# Altium footprint library QFP_LQFP_TQFP.PcbLib: 18 footprints (part 1 of 2)
Each footprint in its own frame and in the unit in brackets; x right, y up, seen from the top. Pads: shape width x height; smd on the part's side, far side on the other; paste and mask are expansions set on the pad; w line width, h text height; cw(c..) or ccw(c..) is an arc to the next point about the centre after c.
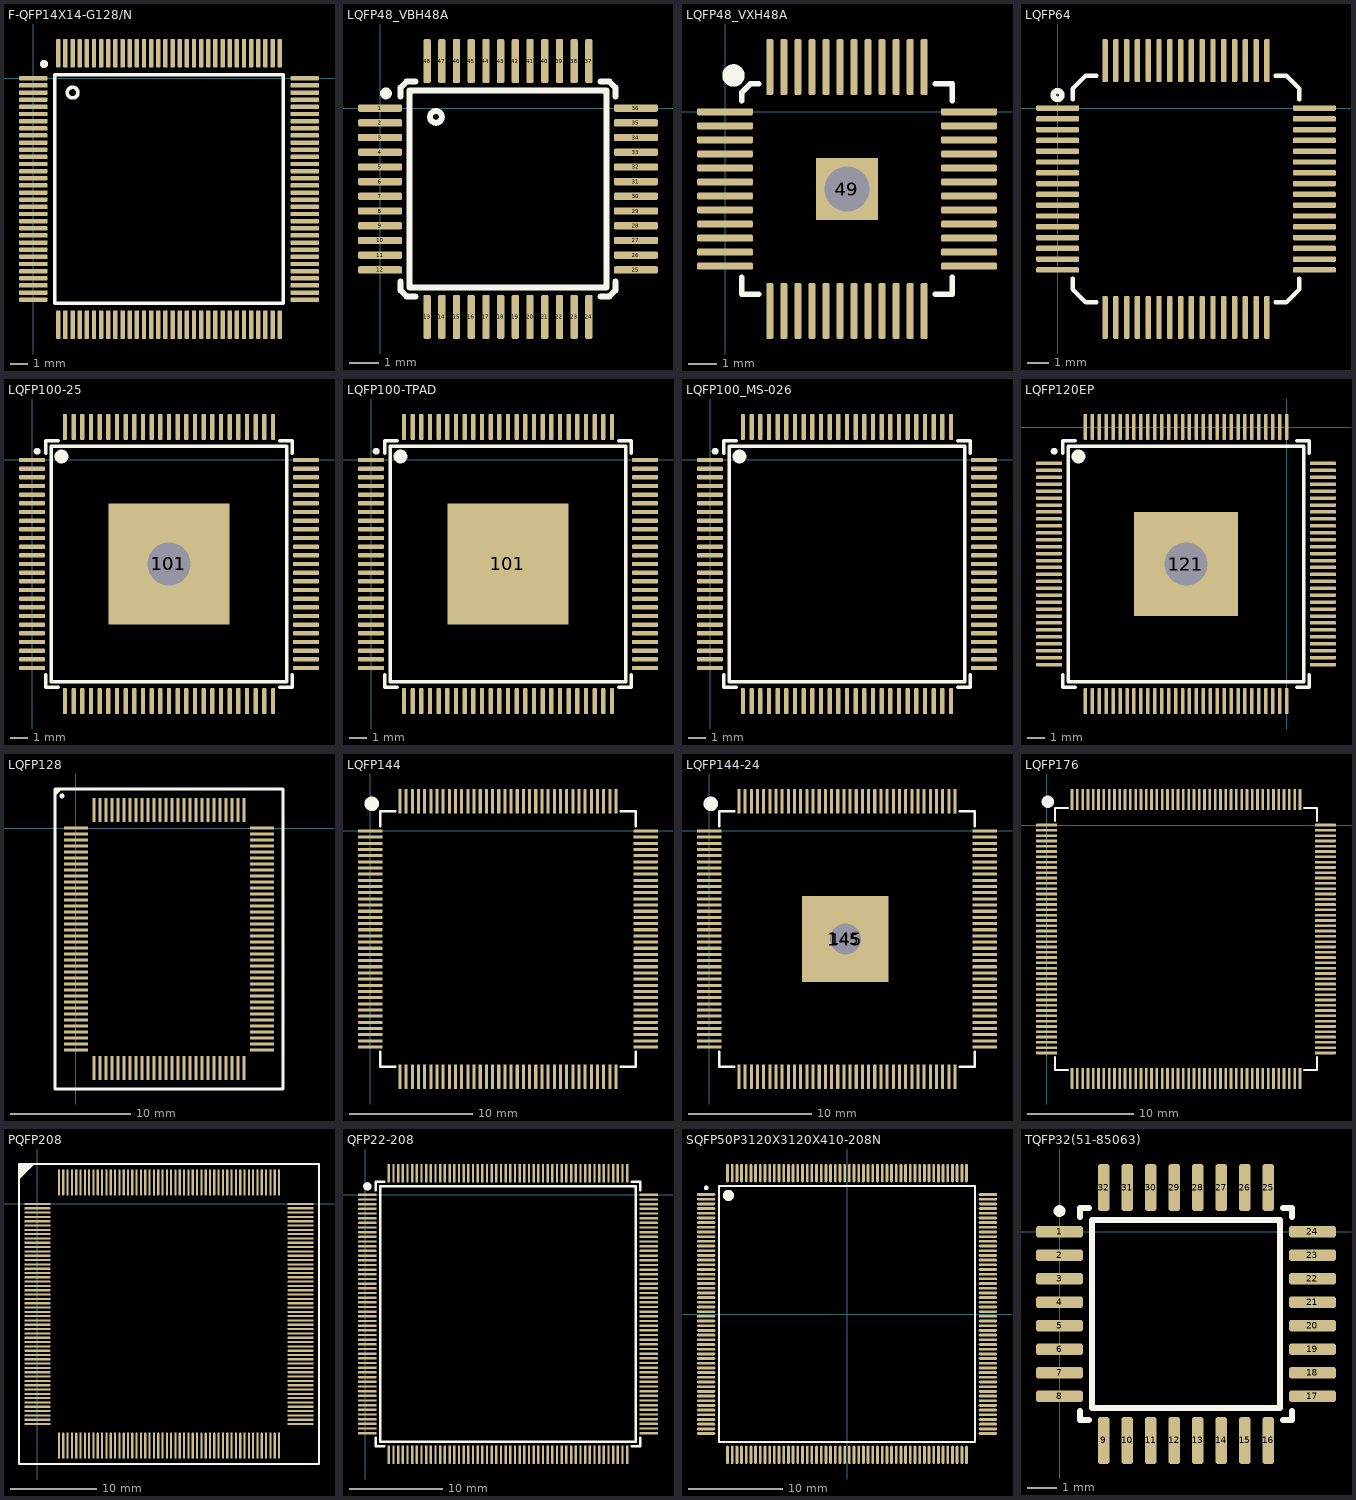
[diagram p0: the footprints below, top view; thin cyan lines are the x and y axes]

## F-QFP14X14-G128/N [mm] "QFP; 128 Leads; Body 14 x 14 mm; Pitch 0.4 mm"
height 2.2
pads (128):
  rrect50% 1.6x0.25 smd: 1(0,0) 2(0,-0.4) 3(0,-0.8) 4(0,-1.2) 5(0,-1.6) 6(0,-2) 7(0,-2.4) 8(0,-2.8) 9(0,-3.2) 10(0,-3.6) 11(0,-4) 12(0,-4.4) 13(0,-4.8) 14(0,-5.2) 15(0,-5.6) 16(0,-6) 17(0,-6.4) 18(0,-6.8) 19(0,-7.2) 20(0,-7.6) 21(0,-8) 22(0,-8.4) 23(0,-8.8) 24(0,-9.2) 25(0,-9.6) 26(0,-10) 27(0,-10.4) 28(0,-10.8) 29(0,-11.2) 30(0,-11.6) 31(0,-12) 32(0,-12.4) 65(15.2,-12.4) 66(15.2,-12) 67(15.2,-11.6) 68(15.2,-11.2) 69(15.2,-10.8) 70(15.2,-10.4) 71(15.2,-10) 72(15.2,-9.6) 73(15.2,-9.2) 74(15.2,-8.8) 75(15.2,-8.4) 76(15.2,-8) 77(15.2,-7.6) 78(15.2,-7.2) 79(15.2,-6.8) 80(15.2,-6.4) 81(15.2,-6) 82(15.2,-5.6) 83(15.2,-5.2) 84(15.2,-4.8) 85(15.2,-4.4) 86(15.2,-4) 87(15.2,-3.6) 88(15.2,-3.2) 89(15.2,-2.8) 90(15.2,-2.4) 91(15.2,-2) 92(15.2,-1.6) 93(15.2,-1.2) 94(15.2,-0.8) 95(15.2,-0.4) 96(15.2,0)
  rrect50% 0.25x1.6 smd: 33(1.4,-13.8) 34(1.8,-13.8) 35(2.2,-13.8) 36(2.6,-13.8) 37(3,-13.8) 38(3.4,-13.8) 39(3.8,-13.8) 40(4.2,-13.8) 41(4.6,-13.8) 42(5,-13.8) 43(5.4,-13.8) 44(5.8,-13.8) 45(6.2,-13.8) 46(6.6,-13.8) 47(7,-13.8) 48(7.4,-13.8) 49(7.8,-13.8) 50(8.2,-13.8) 51(8.6,-13.8) 52(9,-13.8) 53(9.4,-13.8) 54(9.8,-13.8) 55(10.2,-13.8) 56(10.6,-13.8) 57(11,-13.8) 58(11.4,-13.8) 59(11.8,-13.8) 60(12.2,-13.8) 61(12.6,-13.8) 62(13,-13.8) 63(13.4,-13.8) 64(13.8,-13.8) 97(13.8,1.4) 98(13.4,1.4) 99(13,1.4) 100(12.6,1.4) 101(12.2,1.4) 102(11.8,1.4) 103(11.4,1.4) 104(11,1.4) 105(10.6,1.4) 106(10.2,1.4) 107(9.8,1.4) 108(9.4,1.4) 109(9,1.4) 110(8.6,1.4) 111(8.2,1.4) 112(7.8,1.4) 113(7.4,1.4) 114(7,1.4) 115(6.6,1.4) 116(6.2,1.4) 117(5.8,1.4) 118(5.4,1.4) 119(5,1.4) 120(4.6,1.4) 121(4.2,1.4) 122(3.8,1.4) 123(3.4,1.4) 124(3,1.4) 125(2.6,1.4) 126(2.2,1.4) 127(1.8,1.4) 128(1.4,1.4)
Top Overlay:
  circle w0.203: c2.2,-0.8 r0.3
  circle w0.203: c0.6,0.8 r0.125
  lines w0.203: 1.2,-12.6 1.2,0.2 14,0.2 14,-12.6 1.2,-12.6
Top Assembly:
  text ".Designator" at 2.502,-6.733 h1
3D body "User Library-IPC QFP-full.STEP": height 1.35, standoff 0, extent -0.41,-14.212 15.612,1.81

## LQFP48_VBH48A [mm]
pads (48):
  rrect50% 1.5x0.25 smd: 1(0,0) 2(0,-0.5) 3(0,-1) 4(0,-1.5) 5(0,-2) 6(0,-2.5) 7(0,-3) 8(0,-3.5) 9(0,-4) 10(0,-4.5) 11(0,-5) 12(0,-5.5) 25(8.7,-5.5) 26(8.7,-5) 27(8.7,-4.5) 28(8.7,-4) 29(8.7,-3.5) 30(8.7,-3) 31(8.7,-2.5) 32(8.7,-2) 33(8.7,-1.5) 34(8.7,-1) 35(8.7,-0.5) 36(8.7,0)
  rrect50% 0.25x1.5 smd: 13(1.6,-7.1) 14(2.1,-7.1) 15(2.6,-7.1) 16(3.1,-7.1) 17(3.6,-7.1) 18(4.1,-7.1) 19(4.6,-7.1) 20(5.1,-7.1) 21(5.6,-7.1) 22(6.1,-7.1) 23(6.6,-7.1) 24(7.1,-7.1) 37(7.1,1.6) 38(6.6,1.6) 39(6.1,1.6) 40(5.6,1.6) 41(5.1,1.6) 42(4.6,1.6) 43(4.1,1.6) 44(3.6,1.6) 45(3.1,1.6) 46(2.6,1.6) 47(2.1,1.6) 48(1.6,1.6)
Top Overlay:
  circle w0.2: c0.2,0.5 r0.1
  circle w0.2: c1.9,-0.3 r0.2
  lines w0.2: 0.7,-5.9 0.7,-6.2 0.9,-6.4 1.2,-6.4 ; 0.7,0.4 0.7,0.7 0.9,0.9 1.2,0.9 ; 7.5,-6.4 7.8,-6.4 8,-6.2 8,-5.9 ; 7.5,0.9 7.8,0.9 8,0.7 8,0.4 ; 1,-6.1 1,0.6 7.7,0.6 7.7,-6.1 1,-6.1
Top Assembly:
  text ".Designator" at -0.698,-3.133 h1
3D body "SW3dPS-P-LQFP48-7x7-0.50.STEP": height 1.45, standoff 0, extent -0.15,-7.25 8.85,1.75

## LQFP48_VXH48A [mm]
pads (50):
  rrect50% 2x0.25 smd: 1(0,0) 2(0,-0.5) 3(0,-1) 4(0,-1.5) 5(0,-2) 6(0,-2.5) 7(0,-3) 8(0,-3.5) 9(0,-4) 10(0,-4.5) 11(0,-5) 12(0,-5.5) 25(8.7,-5.5) 26(8.7,-5) 27(8.7,-4.5) 28(8.7,-4) 29(8.7,-3.5) 30(8.7,-3) 31(8.7,-2.5) 32(8.7,-2) 33(8.7,-1.5) 34(8.7,-1) 35(8.7,-0.5) 36(8.7,0)
  rrect50% 0.25x2 smd: 13(1.6,-7.1) 14(2.1,-7.1) 15(2.6,-7.1) 16(3.1,-7.1) 17(3.6,-7.1) 18(4.1,-7.1) 19(4.6,-7.1) 20(5.1,-7.1) 21(5.6,-7.1) 22(6.1,-7.1) 23(6.6,-7.1) 24(7.1,-7.1) 37(7.1,1.6) 38(6.6,1.6) 39(6.1,1.6) 40(5.6,1.6) 41(5.1,1.6) 42(4.6,1.6) 43(4.1,1.6) 44(3.6,1.6) 45(3.1,1.6) 46(2.6,1.6) 47(2.1,1.6) 48(1.6,1.6)
  rect 2.2x2.2 smd: 49(4.35,-2.75)
  round 2.2 hole 1.6: 49(4.35,-2.75)
Top Overlay:
  circle w0.4: c0.3,1.3 r0.2
  lines w0.2: 0.6,-5.9 0.6,-6.5 1.2,-6.5 ; 0.6,0.4 0.6,0.7 0.9,1 1.2,1 ; 7.5,-6.5 8.1,-6.5 8.1,-5.9 ; 7.5,1 8.1,1 8.1,0.4
Top Assembly:
  text ".Designator" at -0.648,-3.083 h1
3D body "SW3dPS-P-LQFP48-7x7-0.50.STEP": height 1.45, standoff 0, extent -0.15,-7.25 8.85,1.75

## LQFP64 [mm]
pads (64):
  rrect50% 2x0.25 smd: 1(0,0) 2(0,-0.5) 3(0,-1) 4(0,-1.5) 5(0,-2) 6(0,-2.5) 7(0,-3) 8(0,-3.5) 9(0,-4) 10(0,-4.5) 11(0,-5) 12(0,-5.5) 13(0,-6) 14(0,-6.5) 15(0,-7) 16(0,-7.5) 33(11.9,-7.5) 34(11.9,-7) 35(11.9,-6.5) 36(11.9,-6) 37(11.9,-5.5) 38(11.9,-5) 39(11.9,-4.5) 40(11.9,-4) 41(11.9,-3.5) 42(11.9,-3) 43(11.9,-2.5) 44(11.9,-2) 45(11.9,-1.5) 46(11.9,-1) 47(11.9,-0.5) 48(11.9,0)
  rrect50% 0.25x2 smd: 17(2.2,-9.7) 18(2.7,-9.7) 19(3.2,-9.7) 20(3.7,-9.7) 21(4.2,-9.7) 22(4.7,-9.7) 23(5.2,-9.7) 24(5.7,-9.7) 25(6.2,-9.7) 26(6.7,-9.7) 27(7.2,-9.7) 28(7.7,-9.7) 29(8.2,-9.7) 30(8.7,-9.7) 31(9.2,-9.7) 32(9.7,-9.7) 49(9.7,2.2) 50(9.2,2.2) 51(8.7,2.2) 52(8.2,2.2) 53(7.7,2.2) 54(7.2,2.2) 55(6.7,2.2) 56(6.2,2.2) 57(5.7,2.2) 58(5.2,2.2) 59(4.7,2.2) 60(4.2,2.2) 61(3.7,2.2) 62(3.2,2.2) 63(2.7,2.2) 64(2.2,2.2)
Top Overlay:
  circle w0.254: c0,0.6 r0.2
  lines w0.2: 0.7,-7.9 0.7,-8.4 1.3,-9 1.8,-9 ; 0.7,0.4 0.7,0.9 1.3,1.5 1.8,1.5 ; 10.1,-9 10.6,-9 11.2,-8.4 11.2,-7.9 ; 10.1,1.5 10.6,1.5 11.2,0.9 11.2,0.4
Top Assembly:
  text ".Designator" at 0.902,-4.133 h1
3D body "User Library-lqpf64.STEP": height 1.5, standoff 0.02, extent -0.05,-9.75 11.95,2.25

## LQFP100-25 [mm]
pads (102):
  rrect50% 1.5x0.25 smd: 1(0,0) 2(0,-0.5) 3(0,-1) 4(0,-1.5) 5(0,-2) 6(0,-2.5) 7(0,-3) 8(0,-3.5) 9(0,-4) 10(0,-4.5) 11(0,-5) 12(0,-5.5) 13(0,-6) 14(0,-6.5) 15(0,-7) 16(0,-7.5) 17(0,-8) 18(0,-8.5) 19(0,-9) 20(0,-9.5) 21(0,-10) 22(0,-10.5) 23(0,-11) 24(0,-11.5) 25(0,-12) 51(15.8,-12) 52(15.8,-11.5) 53(15.8,-11) 54(15.8,-10.5) 55(15.8,-10) 56(15.8,-9.5) 57(15.8,-9) 58(15.8,-8.5) 59(15.8,-8) 60(15.8,-7.5) 61(15.8,-7) 62(15.8,-6.5) 63(15.8,-6) 64(15.8,-5.5) 65(15.8,-5) 66(15.8,-4.5) 67(15.8,-4) 68(15.8,-3.5) 69(15.8,-3) 70(15.8,-2.5) 71(15.8,-2) 72(15.8,-1.5) 73(15.8,-1) 74(15.8,-0.5) 75(15.8,0)
  rrect50% 0.25x1.5 smd: 26(1.9,-13.9) 27(2.4,-13.9) 28(2.9,-13.9) 29(3.4,-13.9) 30(3.9,-13.9) 31(4.4,-13.9) 32(4.9,-13.9) 33(5.4,-13.9) 34(5.9,-13.9) 35(6.4,-13.9) 36(6.9,-13.9) 37(7.4,-13.9) 38(7.9,-13.9) 39(8.4,-13.9) 40(8.9,-13.9) 41(9.4,-13.9) 42(9.9,-13.9) 43(10.4,-13.9) 44(10.9,-13.9) 45(11.4,-13.9) 46(11.9,-13.9) 47(12.4,-13.9) 48(12.9,-13.9) 49(13.4,-13.9) 50(13.9,-13.9) 76(13.9,1.9) 77(13.4,1.9) 78(12.9,1.9) 79(12.4,1.9) 80(11.9,1.9) 81(11.4,1.9) 82(10.9,1.9) 83(10.4,1.9) 84(9.9,1.9) 85(9.4,1.9) 86(8.9,1.9) 87(8.4,1.9) 88(7.9,1.9) 89(7.4,1.9) 90(6.9,1.9) 91(6.4,1.9) 92(5.9,1.9) 93(5.4,1.9) 94(4.9,1.9) 95(4.4,1.9) 96(3.9,1.9) 97(3.4,1.9) 98(2.9,1.9) 99(2.4,1.9) 100(1.9,1.9)
  rect 7x7 smd: 101(7.9,-6)
  round 3 hole 2.5: 101(7.9,-6)
Top Overlay:
  circle w0.2: c0.3,0.5 r0.1
  circle w0.4: c1.7,0.2 r0.2
  lines w0.2: 0.8,-12.4 0.8,-13.1 1.5,-13.1 ; 0.8,0.4 0.8,1.1 1.5,1.1 ; 14.3,-13.1 15,-13.1 15,-12.4 ; 14.3,1.1 15,1.1 15,0.4 ; 1.1,-12.8 14.7,-12.8 14.7,0.8 1.1,0.8 1.1,-12.8
Top Assembly:
  text ".Designator" at 2.902,-6.333 h1
3D body "User Library-LQFP100-3.STEP": height 1.62, standoff -0.01, extent -0.175,-14.075 15.968,2.068

## LQFP100-TPAD [mm]
pads (101):
  rrect50% 1.5x0.25 smd: 1(0,0) 2(0,-0.5) 3(0,-1) 4(0,-1.5) 5(0,-2) 6(0,-2.5) 7(0,-3) 8(0,-3.5) 9(0,-4) 10(0,-4.5) 11(0,-5) 12(0,-5.5) 13(0,-6) 14(0,-6.5) 15(0,-7) 16(0,-7.5) 17(0,-8) 18(0,-8.5) 19(0,-9) 20(0,-9.5) 21(0,-10) 22(0,-10.5) 23(0,-11) 24(0,-11.5) 25(0,-12) 51(15.8,-12) 52(15.8,-11.5) 53(15.8,-11) 54(15.8,-10.5) 55(15.8,-10) 56(15.8,-9.5) 57(15.8,-9) 58(15.8,-8.5) 59(15.8,-8) 60(15.8,-7.5) 61(15.8,-7) 62(15.8,-6.5) 63(15.8,-6) 64(15.8,-5.5) 65(15.8,-5) 66(15.8,-4.5) 67(15.8,-4) 68(15.8,-3.5) 69(15.8,-3) 70(15.8,-2.5) 71(15.8,-2) 72(15.8,-1.5) 73(15.8,-1) 74(15.8,-0.5) 75(15.8,0)
  rrect50% 0.25x1.5 smd: 26(1.9,-13.9) 27(2.4,-13.9) 28(2.9,-13.9) 29(3.4,-13.9) 30(3.9,-13.9) 31(4.4,-13.9) 32(4.9,-13.9) 33(5.4,-13.9) 34(5.9,-13.9) 35(6.4,-13.9) 36(6.9,-13.9) 37(7.4,-13.9) 38(7.9,-13.9) 39(8.4,-13.9) 40(8.9,-13.9) 41(9.4,-13.9) 42(9.9,-13.9) 43(10.4,-13.9) 44(10.9,-13.9) 45(11.4,-13.9) 46(11.9,-13.9) 47(12.4,-13.9) 48(12.9,-13.9) 49(13.4,-13.9) 50(13.9,-13.9) 76(13.9,1.9) 77(13.4,1.9) 78(12.9,1.9) 79(12.4,1.9) 80(11.9,1.9) 81(11.4,1.9) 82(10.9,1.9) 83(10.4,1.9) 84(9.9,1.9) 85(9.4,1.9) 86(8.9,1.9) 87(8.4,1.9) 88(7.9,1.9) 89(7.4,1.9) 90(6.9,1.9) 91(6.4,1.9) 92(5.9,1.9) 93(5.4,1.9) 94(4.9,1.9) 95(4.4,1.9) 96(3.9,1.9) 97(3.4,1.9) 98(2.9,1.9) 99(2.4,1.9) 100(1.9,1.9)
  rect 7x7 smd: 101(7.9,-6)
Top Overlay:
  circle w0.2: c0.3,0.5 r0.1
  circle w0.4: c1.7,0.2 r0.2
  lines w0.2: 0.8,-12.4 0.8,-13.1 1.5,-13.1 ; 0.8,0.4 0.8,1.1 1.5,1.1 ; 14.3,-13.1 15,-13.1 15,-12.4 ; 14.3,1.1 15,1.1 15,0.4 ; 1.1,-12.8 14.7,-12.8 14.7,0.8 1.1,0.8 1.1,-12.8
Top Assembly:
  text ".Designator" at 2.902,-6.333 h1
3D body "User Library-LQFP100-3.STEP": height 1.62, standoff -0.01, extent -0.175,-14.075 15.968,2.068

## LQFP100_MS-026 [mm]
pads (100):
  rrect50% 1.5x0.25 smd: 1(0,0) 2(0,-0.5) 3(0,-1) 4(0,-1.5) 5(0,-2) 6(0,-2.5) 7(0,-3) 8(0,-3.5) 9(0,-4) 10(0,-4.5) 11(0,-5) 12(0,-5.5) 13(0,-6) 14(0,-6.5) 15(0,-7) 16(0,-7.5) 17(0,-8) 18(0,-8.5) 19(0,-9) 20(0,-9.5) 21(0,-10) 22(0,-10.5) 23(0,-11) 24(0,-11.5) 25(0,-12) 51(15.8,-12) 52(15.8,-11.5) 53(15.8,-11) 54(15.8,-10.5) 55(15.8,-10) 56(15.8,-9.5) 57(15.8,-9) 58(15.8,-8.5) 59(15.8,-8) 60(15.8,-7.5) 61(15.8,-7) 62(15.8,-6.5) 63(15.8,-6) 64(15.8,-5.5) 65(15.8,-5) 66(15.8,-4.5) 67(15.8,-4) 68(15.8,-3.5) 69(15.8,-3) 70(15.8,-2.5) 71(15.8,-2) 72(15.8,-1.5) 73(15.8,-1) 74(15.8,-0.5) 75(15.8,0)
  rrect50% 0.25x1.5 smd: 26(1.9,-13.9) 27(2.4,-13.9) 28(2.9,-13.9) 29(3.4,-13.9) 30(3.9,-13.9) 31(4.4,-13.9) 32(4.9,-13.9) 33(5.4,-13.9) 34(5.9,-13.9) 35(6.4,-13.9) 36(6.9,-13.9) 37(7.4,-13.9) 38(7.9,-13.9) 39(8.4,-13.9) 40(8.9,-13.9) 41(9.4,-13.9) 42(9.9,-13.9) 43(10.4,-13.9) 44(10.9,-13.9) 45(11.4,-13.9) 46(11.9,-13.9) 47(12.4,-13.9) 48(12.9,-13.9) 49(13.4,-13.9) 50(13.9,-13.9) 76(13.9,1.9) 77(13.4,1.9) 78(12.9,1.9) 79(12.4,1.9) 80(11.9,1.9) 81(11.4,1.9) 82(10.9,1.9) 83(10.4,1.9) 84(9.9,1.9) 85(9.4,1.9) 86(8.9,1.9) 87(8.4,1.9) 88(7.9,1.9) 89(7.4,1.9) 90(6.9,1.9) 91(6.4,1.9) 92(5.9,1.9) 93(5.4,1.9) 94(4.9,1.9) 95(4.4,1.9) 96(3.9,1.9) 97(3.4,1.9) 98(2.9,1.9) 99(2.4,1.9) 100(1.9,1.9)
Top Overlay:
  circle w0.4: c1.7,0.2 r0.2
  circle w0.2: c0.3,0.5 r0.1
  lines w0.2: 0.8,-12.4 0.8,-13.1 1.5,-13.1 ; 0.8,0.4 0.8,1.1 1.5,1.1 ; 14.3,-13.1 15,-13.1 15,-12.4 ; 14.3,1.1 15,1.1 15,0.4 ; 1.1,-12.8 1.1,0.8 14.7,0.8 14.7,-12.8 1.1,-12.8
Top Assembly:
  text ".Designator" at 3.102,-6.433 h1
3D body "User Library-LQFP100-3.STEP": height 1.62, standoff -0.01, extent -0.175,-14.075 15.968,2.068

## LQFP120EP [mm]
pads (122):
  rrect50% 1.5x0.2 smd: 1(-13.7,-2.1) 2(-13.7,-2.5) 3(-13.7,-2.9) 4(-13.7,-3.3) 5(-13.7,-3.7) 6(-13.7,-4.1) 7(-13.7,-4.5) 8(-13.7,-4.9) 9(-13.7,-5.3) 10(-13.7,-5.7) 11(-13.7,-6.1) 12(-13.7,-6.5) 13(-13.7,-6.9) 14(-13.7,-7.3) 15(-13.7,-7.7) 16(-13.7,-8.1) 17(-13.7,-8.5) 18(-13.7,-8.9) 19(-13.7,-9.3) 20(-13.7,-9.7) 21(-13.7,-10.1) 22(-13.7,-10.5) 23(-13.7,-10.9) 24(-13.7,-11.3) 25(-13.7,-11.7) 26(-13.7,-12.1) 27(-13.7,-12.5) 28(-13.7,-12.9) 29(-13.7,-13.3) 30(-13.7,-13.7) 61(2.1,-13.7) 62(2.1,-13.3) 63(2.1,-12.9) 64(2.1,-12.5) 65(2.1,-12.1) 66(2.1,-11.7) 67(2.1,-11.3) 68(2.1,-10.9) 69(2.1,-10.5) 70(2.1,-10.1) 71(2.1,-9.7) 72(2.1,-9.3) 73(2.1,-8.9) 74(2.1,-8.5) 75(2.1,-8.1) 76(2.1,-7.7) 77(2.1,-7.3) 78(2.1,-6.9) 79(2.1,-6.5) 80(2.1,-6.1) 81(2.1,-5.7) 82(2.1,-5.3) 83(2.1,-4.9) 84(2.1,-4.5) 85(2.1,-4.1) 86(2.1,-3.7) 87(2.1,-3.3) 88(2.1,-2.9) 89(2.1,-2.5) 90(2.1,-2.1)
  rrect50% 0.2x1.5 smd: 31(-11.6,-15.8) 32(-11.2,-15.8) 33(-10.8,-15.8) 34(-10.4,-15.8) 35(-10,-15.8) 36(-9.6,-15.8) 37(-9.2,-15.8) 38(-8.8,-15.8) 39(-8.4,-15.8) 40(-8,-15.8) 41(-7.6,-15.8) 42(-7.2,-15.8) 43(-6.8,-15.8) 44(-6.4,-15.8) 45(-6,-15.8) 46(-5.6,-15.8) 47(-5.2,-15.8) 48(-4.8,-15.8) 49(-4.4,-15.8) 50(-4,-15.8) 51(-3.6,-15.8) 52(-3.2,-15.8) 53(-2.8,-15.8) 54(-2.4,-15.8) 55(-2,-15.8) 56(-1.6,-15.8) 57(-1.2,-15.8) 58(-0.8,-15.8) 59(-0.4,-15.8) 60(0,-15.8) 91(0,0) 92(-0.4,0) 93(-0.8,0) 94(-1.2,0) 95(-1.6,0) 96(-2,0) 97(-2.4,0) 98(-2.8,0) 99(-3.2,0) 100(-3.6,0) 101(-4,0) 102(-4.4,0) 103(-4.8,0) 104(-5.2,0) 105(-5.6,0) 106(-6,0) 107(-6.4,0) 108(-6.8,0) 109(-7.2,0) 110(-7.6,0) 111(-8,0) 112(-8.4,0) 113(-8.8,0) 114(-9.2,0) 115(-9.6,0) 116(-10,0) 117(-10.4,0) 118(-10.8,0) 119(-11.2,0) 120(-11.6,0)
  rect 6x6 smd: 121(-5.8,-7.9)
  round 3 hole 2.5: 121(-5.8,-7.9)
Top Overlay:
  circle w0.4: c-12,-1.7 r0.2
  circle w0.2: c-13.4,-1.4 r0.1
  lines w0.2: -12.9,-14.3 -12.9,-15 -12.2,-15 ; -12.9,-1.5 -12.9,-0.8 -12.2,-0.8 ; 0.6,-15 1.3,-15 1.3,-14.3 ; 0.6,-0.8 1.3,-0.8 1.3,-1.5 ; -12.6,-14.7 -12.6,-1.1 1,-1.1 1,-14.7 -12.6,-14.7
Top Assembly:
  text ".Designator" at -10.798,-8.233 h1
3D body "User Library-LQFP120.STEP": height 1.62, standoff -0.01, extent -13.872,-15.972 2.272,0.172

## LQFP128 [mm]
pads (128):
  rrect50% 2x0.25 smd: 1(0,0) 2(0,-0.5) 3(0,-1) 4(0,-1.5) 5(0,-2) 6(0,-2.5) 7(0,-3) 8(0,-3.5) 9(0,-4) 10(0,-4.5) 11(0,-5) 12(0,-5.5) 13(0,-6) 14(0,-6.5) 15(0,-7) 16(0,-7.5) 17(0,-8) 18(0,-8.5) 19(0,-9) 20(0,-9.5) 21(0,-10) 22(0,-10.5) 23(0,-11) 24(0,-11.5) 25(0,-12) 26(0,-12.5) 27(0,-13) 28(0,-13.5) 29(0,-14) 30(0,-14.5) 31(0,-15) 32(0,-15.5) 33(0,-16) 34(0,-16.5) 35(0,-17) 36(0,-17.5) 37(0,-18) 38(0,-18.5) 65(15.5,-18.5) 66(15.5,-18) 67(15.5,-17.5) 68(15.5,-17) 69(15.5,-16.5) 70(15.5,-16) 71(15.5,-15.5) 72(15.5,-15) 73(15.5,-14.5) 74(15.5,-14) 75(15.5,-13.5) 76(15.5,-13) 77(15.5,-12.5) 78(15.5,-12) 79(15.5,-11.5) 80(15.5,-11) 81(15.5,-10.5) 82(15.5,-10) 83(15.5,-9.5) 84(15.5,-9) 85(15.5,-8.5) 86(15.5,-8) 87(15.5,-7.5) 88(15.5,-7) 89(15.5,-6.5) 90(15.5,-6) 91(15.5,-5.5) 92(15.5,-5) 93(15.5,-4.5) 94(15.5,-4) 95(15.5,-3.5) 96(15.5,-3) 97(15.5,-2.5) 98(15.5,-2) 99(15.5,-1.5) 100(15.5,-1) 101(15.5,-0.5) 102(15.5,0)
  rrect50% 0.25x2 smd: 39(1.5,-20) 40(2,-20) 41(2.5,-20) 42(3,-20) 43(3.5,-20) 44(4,-20) 45(4.5,-20) 46(5,-20) 47(5.5,-20) 48(6,-20) 49(6.5,-20) 50(7,-20) 51(7.5,-20) 52(8,-20) 53(8.5,-20) 54(9,-20) 55(9.5,-20) 56(10,-20) 57(10.5,-20) 58(11,-20) 59(11.5,-20) 60(12,-20) 61(12.5,-20) 62(13,-20) 63(13.5,-20) 64(14,-20) 103(14,1.5) 104(13.5,1.5) 105(13,1.5) 106(12.5,1.5) 107(12,1.5) 108(11.5,1.5) 109(11,1.5) 110(10.5,1.5) 111(10,1.5) 112(9.5,1.5) 113(9,1.5) 114(8.5,1.5) 115(8,1.5) 116(7.5,1.5) 117(7,1.5) 118(6.5,1.5) 119(6,1.5) 120(5.5,1.5) 121(5,1.5) 122(4.5,1.5) 123(4,1.5) 124(3.5,1.5) 125(3,1.5) 126(2.5,1.5) 127(2,1.5) 128(1.5,1.5)
Top Overlay:
  circle w0.2: c-1.17,2.67 r0.1
  lines w0.254: -1.75,2.82 -1.32,3.25 ; -1.75,-21.75 -1.75,3.25 17.25,3.25 17.25,-21.75 -1.75,-21.75
Top Assembly:
  text ".Designator" at 2.902,-10.633 h1

## LQFP144 [mm]
pads (144):
  rrect50% 2x0.25 smd: 1(0,0) 2(0,-0.5) 3(0,-1) 4(0,-1.5) 5(0,-2) 6(0,-2.5) 7(0,-3) 8(0,-3.5) 9(0,-4) 10(0,-4.5) 11(0,-5) 12(0,-5.5) 13(0,-6) 14(0,-6.5) 15(0,-7) 16(0,-7.5) 17(0,-8) 18(0,-8.5) 19(0,-9) 20(0,-9.5) 21(0,-10) 22(0,-10.5) 23(0,-11) 24(0,-11.5) 25(0,-12) 26(0,-12.5) 27(0,-13) 28(0,-13.5) 29(0,-14) 30(0,-14.5) 31(0,-15) 32(0,-15.5) 33(0,-16) 34(0,-16.5) 35(0,-17) 36(0,-17.5) 73(22.3,-17.5) 74(22.3,-17) 75(22.3,-16.5) 76(22.3,-16) 77(22.3,-15.5) 78(22.3,-15) 79(22.3,-14.5) 80(22.3,-14) 81(22.3,-13.5) 82(22.3,-13) 83(22.3,-12.5) 84(22.3,-12) 85(22.3,-11.5) 86(22.3,-11) 87(22.3,-10.5) 88(22.3,-10) 89(22.3,-9.5) 90(22.3,-9) 91(22.3,-8.5) 92(22.3,-8) 93(22.3,-7.5) 94(22.3,-7) 95(22.3,-6.5) 96(22.3,-6) 97(22.3,-5.5) 98(22.3,-5) 99(22.3,-4.5) 100(22.3,-4) 101(22.3,-3.5) 102(22.3,-3) 103(22.3,-2.5) 104(22.3,-2) 105(22.3,-1.5) 106(22.3,-1) 107(22.3,-0.5) 108(22.3,0)
  rrect50% 0.25x2 smd: 37(2.4,-19.9) 38(2.9,-19.9) 39(3.4,-19.9) 40(3.9,-19.9) 41(4.4,-19.9) 42(4.9,-19.9) 43(5.4,-19.9) 44(5.9,-19.9) 45(6.4,-19.9) 46(6.9,-19.9) 47(7.4,-19.9) 48(7.9,-19.9) 49(8.4,-19.9) 50(8.9,-19.9) 51(9.4,-19.9) 52(9.9,-19.9) 53(10.4,-19.9) 54(10.9,-19.9) 55(11.4,-19.9) 56(11.9,-19.9) 57(12.4,-19.9) 58(12.9,-19.9) 59(13.4,-19.9) 60(13.9,-19.9) 61(14.4,-19.9) 62(14.9,-19.9) 63(15.4,-19.9) 64(15.9,-19.9) 65(16.4,-19.9) 66(16.9,-19.9) 67(17.4,-19.9) 68(17.9,-19.9) 69(18.4,-19.9) 70(18.9,-19.9) 71(19.4,-19.9) 72(19.9,-19.9) 109(19.9,2.4) 110(19.4,2.4) 111(18.9,2.4) 112(18.4,2.4) 113(17.9,2.4) 114(17.4,2.4) 115(16.9,2.4) 116(16.4,2.4) 117(15.9,2.4) 118(15.4,2.4) 119(14.9,2.4) 120(14.4,2.4) 121(13.9,2.4) 122(13.4,2.4) 123(12.9,2.4) 124(12.4,2.4) 125(11.9,2.4) 126(11.4,2.4) 127(10.9,2.4) 128(10.4,2.4) 129(9.9,2.4) 130(9.4,2.4) 131(8.9,2.4) 132(8.4,2.4) 133(7.9,2.4) 134(7.4,2.4) 135(6.9,2.4) 136(6.4,2.4) 137(5.9,2.4) 138(5.4,2.4) 139(4.9,2.4) 140(4.4,2.4) 141(3.9,2.4) 142(3.4,2.4) 143(2.9,2.4) 144(2.4,2.4)
Top Overlay:
  circle w0.6: c0.117,2.2 r0.283
  lines w0.2: 0.8,-17.9 0.8,-19.1 2,-19.1 ; 0.8,0.4 0.8,1.6 2,1.6 ; 20.3,-19.1 21.5,-19.1 21.5,-17.9 ; 20.3,1.6 21.5,1.6 21.5,0.4
Top Assembly:
  text ".Designator" at 6.402,-9.433 h1
3D body "QFP50P2200X2200X145-144N MS-026BFB VNG144A.STEP": height 1.6, standoff 0, extent 0.135,-19.765 22.163,2.263

## LQFP144-24 [mm]
pads (146):
  rrect50% 2x0.25 smd: 1(0,0) 2(0,-0.5) 3(0,-1) 4(0,-1.5) 5(0,-2) 6(0,-2.5) 7(0,-3) 8(0,-3.5) 9(0,-4) 10(0,-4.5) 11(0,-5) 12(0,-5.5) 13(0,-6) 14(0,-6.5) 15(0,-7) 16(0,-7.5) 17(0,-8) 18(0,-8.5) 19(0,-9) 20(0,-9.5) 21(0,-10) 22(0,-10.5) 23(0,-11) 24(0,-11.5) 25(0,-12) 26(0,-12.5) 27(0,-13) 28(0,-13.5) 29(0,-14) 30(0,-14.5) 31(0,-15) 32(0,-15.5) 33(0,-16) 34(0,-16.5) 35(0,-17) 36(0,-17.5) 73(22.3,-17.5) 74(22.3,-17) 75(22.3,-16.5) 76(22.3,-16) 77(22.3,-15.5) 78(22.3,-15) 79(22.3,-14.5) 80(22.3,-14) 81(22.3,-13.5) 82(22.3,-13) 83(22.3,-12.5) 84(22.3,-12) 85(22.3,-11.5) 86(22.3,-11) 87(22.3,-10.5) 88(22.3,-10) 89(22.3,-9.5) 90(22.3,-9) 91(22.3,-8.5) 92(22.3,-8) 93(22.3,-7.5) 94(22.3,-7) 95(22.3,-6.5) 96(22.3,-6) 97(22.3,-5.5) 98(22.3,-5) 99(22.3,-4.5) 100(22.3,-4) 101(22.3,-3.5) 102(22.3,-3) 103(22.3,-2.5) 104(22.3,-2) 105(22.3,-1.5) 106(22.3,-1) 107(22.3,-0.5) 108(22.3,0)
  rrect50% 0.25x2 smd: 37(2.4,-19.9) 38(2.9,-19.9) 39(3.4,-19.9) 40(3.9,-19.9) 41(4.4,-19.9) 42(4.9,-19.9) 43(5.4,-19.9) 44(5.9,-19.9) 45(6.4,-19.9) 46(6.9,-19.9) 47(7.4,-19.9) 48(7.9,-19.9) 49(8.4,-19.9) 50(8.9,-19.9) 51(9.4,-19.9) 52(9.9,-19.9) 53(10.4,-19.9) 54(10.9,-19.9) 55(11.4,-19.9) 56(11.9,-19.9) 57(12.4,-19.9) 58(12.9,-19.9) 59(13.4,-19.9) 60(13.9,-19.9) 61(14.4,-19.9) 62(14.9,-19.9) 63(15.4,-19.9) 64(15.9,-19.9) 65(16.4,-19.9) 66(16.9,-19.9) 67(17.4,-19.9) 68(17.9,-19.9) 69(18.4,-19.9) 70(18.9,-19.9) 71(19.4,-19.9) 72(19.9,-19.9) 109(19.9,2.4) 110(19.4,2.4) 111(18.9,2.4) 112(18.4,2.4) 113(17.9,2.4) 114(17.4,2.4) 115(16.9,2.4) 116(16.4,2.4) 117(15.9,2.4) 118(15.4,2.4) 119(14.9,2.4) 120(14.4,2.4) 121(13.9,2.4) 122(13.4,2.4) 123(12.9,2.4) 124(12.4,2.4) 125(11.9,2.4) 126(11.4,2.4) 127(10.9,2.4) 128(10.4,2.4) 129(9.9,2.4) 130(9.4,2.4) 131(8.9,2.4) 132(8.4,2.4) 133(7.9,2.4) 134(7.4,2.4) 135(6.9,2.4) 136(6.4,2.4) 137(5.9,2.4) 138(5.4,2.4) 139(4.9,2.4) 140(4.4,2.4) 141(3.9,2.4) 142(3.4,2.4) 143(2.9,2.4) 144(2.4,2.4)
  rect 7x7 smd: 145(11.025,-8.75)
  round 3 hole 2.5: 145(11.025,-8.75)
Top Overlay:
  circle w0.6: c0.117,2.2 r0.283
  lines w0.2: 0.8,-17.9 0.8,-19.1 2,-19.1 ; 0.8,0.4 0.8,1.6 2,1.6 ; 20.3,-19.1 21.5,-19.1 21.5,-17.9 ; 20.3,1.6 21.5,1.6 21.5,0.4
Top Assembly:
  text ".Designator" at 6.027,-9.083 h1
3D body "QFP50P2200X2200X145-144N MS-026BFB VNG144A.STEP": height 1.6, standoff 0, extent 0.135,-19.765 22.163,2.263

## LQFP176 [mm]
pads (176):
  rrect50% 2x0.25 smd: 1(0,0) 2(0,-0.5) 3(0,-1) 4(0,-1.5) 5(0,-2) 6(0,-2.5) 7(0,-3) 8(0,-3.5) 9(0,-4) 10(0,-4.5) 11(0,-5) 12(0,-5.5) 13(0,-6) 14(0,-6.5) 15(0,-7) 16(0,-7.5) 17(0,-8) 18(0,-8.5) 19(0,-9) 20(0,-9.5) 21(0,-10) 22(0,-10.5) 23(0,-11) 24(0,-11.5) 25(0,-12) 26(0,-12.5) 27(0,-13) 28(0,-13.5) 29(0,-14) 30(0,-14.5) 31(0,-15) 32(0,-15.5) 33(0,-16) 34(0,-16.5) 35(0,-17) 36(0,-17.5) 37(0,-18) 38(0,-18.5) 39(0,-19) 40(0,-19.5) 41(0,-20) 42(0,-20.5) 43(0,-21) 44(0,-21.5) 89(26.3,-21.5) 90(26.3,-21) 91(26.3,-20.5) 92(26.3,-20) 93(26.3,-19.5) 94(26.3,-19) 95(26.3,-18.5) 96(26.3,-18) 97(26.3,-17.5) 98(26.3,-17) 99(26.3,-16.5) 100(26.3,-16) 101(26.3,-15.5) 102(26.3,-15) 103(26.3,-14.5) 104(26.3,-14) 105(26.3,-13.5) 106(26.3,-13) 107(26.3,-12.5) 108(26.3,-12) 109(26.3,-11.5) 110(26.3,-11) 111(26.3,-10.5) 112(26.3,-10) 113(26.3,-9.5) 114(26.3,-9) 115(26.3,-8.5) 116(26.3,-8) 117(26.3,-7.5) 118(26.3,-7) 119(26.3,-6.5) 120(26.3,-6) 121(26.3,-5.5) 122(26.3,-5) 123(26.3,-4.5) 124(26.3,-4) 125(26.3,-3.5) 126(26.3,-3) 127(26.3,-2.5) 128(26.3,-2) 129(26.3,-1.5) 130(26.3,-1) 131(26.3,-0.5) 132(26.3,0)
  rrect50% 0.25x2 smd: 45(2.4,-23.9) 46(2.9,-23.9) 47(3.4,-23.9) 48(3.9,-23.9) 49(4.4,-23.9) 50(4.9,-23.9) 51(5.4,-23.9) 52(5.9,-23.9) 53(6.4,-23.9) 54(6.9,-23.9) 55(7.4,-23.9) 56(7.9,-23.9) 57(8.4,-23.9) 58(8.9,-23.9) 59(9.4,-23.9) 60(9.9,-23.9) 61(10.4,-23.9) 62(10.9,-23.9) 63(11.4,-23.9) 64(11.9,-23.9) 65(12.4,-23.9) 66(12.9,-23.9) 67(13.4,-23.9) 68(13.9,-23.9) 69(14.4,-23.9) 70(14.9,-23.9) 71(15.4,-23.9) 72(15.9,-23.9) 73(16.4,-23.9) 74(16.9,-23.9) 75(17.4,-23.9) 76(17.9,-23.9) 77(18.4,-23.9) 78(18.9,-23.9) 79(19.4,-23.9) 80(19.9,-23.9) 81(20.4,-23.9) 82(20.9,-23.9) 83(21.4,-23.9) 84(21.9,-23.9) 85(22.4,-23.9) 86(22.9,-23.9) 87(23.4,-23.9) 88(23.9,-23.9) 133(23.9,2.4) 134(23.4,2.4) 135(22.9,2.4) 136(22.4,2.4) 137(21.9,2.4) 138(21.4,2.4) 139(20.9,2.4) 140(20.4,2.4) 141(19.9,2.4) 142(19.4,2.4) 143(18.9,2.4) 144(18.4,2.4) 145(17.9,2.4) 146(17.4,2.4) 147(16.9,2.4) 148(16.4,2.4) 149(15.9,2.4) 150(15.4,2.4) 151(14.9,2.4) 152(14.4,2.4) 153(13.9,2.4) 154(13.4,2.4) 155(12.9,2.4) 156(12.4,2.4) 157(11.9,2.4) 158(11.4,2.4) 159(10.9,2.4) 160(10.4,2.4) 161(9.9,2.4) 162(9.4,2.4) 163(8.9,2.4) 164(8.4,2.4) 165(7.9,2.4) 166(7.4,2.4) 167(6.9,2.4) 168(6.4,2.4) 169(5.9,2.4) 170(5.4,2.4) 171(4.9,2.4) 172(4.4,2.4) 173(3.9,2.4) 174(3.4,2.4) 175(2.9,2.4) 176(2.4,2.4)
Top Overlay:
  circle w0.6: c0.117,2.2 r0.283
  lines w0.2: 0.8,-21.9 0.8,-23.1 2,-23.1 ; 0.8,0.4 0.8,1.6 2,1.6 ; 24.3,-23.1 25.5,-23.1 25.5,-21.9 ; 24.3,1.6 25.5,1.6 25.5,0.4
Top Assembly:
  text ".Designator" at 8.402,-11.133 h1
3D body "LQFP176.STEP": height 1.75, standoff 0, extent 0.135,-23.763 26.163,2.265

## PQFP208 [mm]
pads (208):
  rrect50% 3x0.25 smd: 1(0,0) 2(0,-0.5) 3(0,-1) 4(0,-1.5) 5(0,-2) 6(0,-2.5) 7(0,-3) 8(0,-3.5) 9(0,-4) 10(0,-4.5) 11(0,-5) 12(0,-5.5) 13(0,-6) 14(0,-6.5) 15(0,-7) 16(0,-7.5) 17(0,-8) 18(0,-8.5) 19(0,-9) 20(0,-9.5) 21(0,-10) 22(0,-10.5) 23(0,-11) 24(0,-11.5) 25(0,-12) 26(0,-12.5) 27(0,-13) 28(0,-13.5) 29(0,-14) 30(0,-14.5) 31(0,-15) 32(0,-15.5) 33(0,-16) 34(0,-16.5) 35(0,-17) 36(0,-17.5) 37(0,-18) 38(0,-18.5) 39(0,-19) 40(0,-19.5) 41(0,-20) 42(0,-20.5) 43(0,-21) 44(0,-21.5) 45(0,-22) 46(0,-22.5) 47(0,-23) 48(0,-23.5) 49(0,-24) 50(0,-24.5) 51(0,-25) 52(0,-25.5) 105(30.5,-25.5) 106(30.5,-25) 107(30.5,-24.5) 108(30.5,-24) 109(30.5,-23.5) 110(30.5,-23) 111(30.5,-22.5) 112(30.5,-22) 113(30.5,-21.5) 114(30.5,-21) 115(30.5,-20.5) 116(30.5,-20) 117(30.5,-19.5) 118(30.5,-19) 119(30.5,-18.5) 120(30.5,-18) 121(30.5,-17.5) 122(30.5,-17) 123(30.5,-16.5) 124(30.5,-16) 125(30.5,-15.5) 126(30.5,-15) 127(30.5,-14.5) 128(30.5,-14) 129(30.5,-13.5) 130(30.5,-13) 131(30.5,-12.5) 132(30.5,-12) 133(30.5,-11.5) 134(30.5,-11) 135(30.5,-10.5) 136(30.5,-10) 137(30.5,-9.5) 138(30.5,-9) 139(30.5,-8.5) 140(30.5,-8) 141(30.5,-7.5) 142(30.5,-7) 143(30.5,-6.5) 144(30.5,-6) 145(30.5,-5.5) 146(30.5,-5) 147(30.5,-4.5) 148(30.5,-4) 149(30.5,-3.5) 150(30.5,-3) 151(30.5,-2.5) 152(30.5,-2) 153(30.5,-1.5) 154(30.5,-1) 155(30.5,-0.5) 156(30.5,0)
  rrect50% 0.25x3 smd: 53(2.5,-28) 54(3,-28) 55(3.5,-28) 56(4,-28) 57(4.5,-28) 58(5,-28) 59(5.5,-28) 60(6,-28) 61(6.5,-28) 62(7,-28) 63(7.5,-28) 64(8,-28) 65(8.5,-28) 66(9,-28) 67(9.5,-28) 68(10,-28) 69(10.5,-28) 70(11,-28) 71(11.5,-28) 72(12,-28) 73(12.5,-28) 74(13,-28) 75(13.5,-28) 76(14,-28) 77(14.5,-28) 78(15,-28) 79(15.5,-28) 80(16,-28) 81(16.5,-28) 82(17,-28) 83(17.5,-28) 84(18,-28) 85(18.5,-28) 86(19,-28) 87(19.5,-28) 88(20,-28) 89(20.5,-28) 90(21,-28) 91(21.5,-28) 92(22,-28) 93(22.5,-28) 94(23,-28) 95(23.5,-28) 96(24,-28) 97(24.5,-28) 98(25,-28) 99(25.5,-28) 100(26,-28) 101(26.5,-28) 102(27,-28) 103(27.5,-28) 104(28,-28) 157(28,2.5) 158(27.5,2.5) 159(27,2.5) 160(26.5,2.5) 161(26,2.5) 162(25.5,2.5) 163(25,2.5) 164(24.5,2.5) 165(24,2.5) 166(23.5,2.5) 167(23,2.5) 168(22.5,2.5) 169(22,2.5) 170(21.5,2.5) 171(21,2.5) 172(20.5,2.5) 173(20,2.5) 174(19.5,2.5) 175(19,2.5) 176(18.5,2.5) 177(18,2.5) 178(17.5,2.5) 179(17,2.5) 180(16.5,2.5) 181(16,2.5) 182(15.5,2.5) 183(15,2.5) 184(14.5,2.5) 185(14,2.5) 186(13.5,2.5) 187(13,2.5) 188(12.5,2.5) 189(12,2.5) 190(11.5,2.5) 191(11,2.5) 192(10.5,2.5) 193(10,2.5) 194(9.5,2.5) 195(9,2.5) 196(8.5,2.5) 197(8,2.5) 198(7.5,2.5) 199(7,2.5) 200(6.5,2.5) 201(6,2.5) 202(5.5,2.5) 203(5,2.5) 204(4.5,2.5) 205(4,2.5) 206(3.5,2.5) 207(3,2.5) 208(2.5,2.5)
Top Overlay:
  region: -2.13,2.88 -0.38,4.63 -2.13,4.63
  lines w0.254: -2.13,-30.13 -2.13,4.63 32.63,4.63 32.63,-30.13 -2.13,-30.13
Top Assembly:
  text ".Designator" at 10.502,-13.233 h1
3D body "User Library-IPC QFP-full.STEP": height 4.25, standoff 0, extent -0.065,-28.063 30.563,2.565

## QFP22-208 [mm]
height 1.45
pads (208):
  rrect50% 2x0.25 smd: 1(0.2,0) 2(0.2,-0.5) 3(0.2,-1) 4(0.2,-1.5) 5(0.2,-2) 6(0.2,-2.5) 7(0.2,-3) 8(0.2,-3.5) 9(0.2,-4) 10(0.2,-4.5) 11(0.2,-5) 12(0.2,-5.5) 13(0.2,-6) 14(0.2,-6.5) 15(0.2,-7) 16(0.2,-7.5) 17(0.2,-8) 18(0.2,-8.5) 19(0.2,-9) 20(0.2,-9.5) 21(0.2,-10) 22(0.2,-10.5) 23(0.2,-11) 24(0.2,-11.5) 25(0.2,-12) 26(0.2,-12.5) 27(0.2,-13) 28(0.2,-13.5) 29(0.2,-14) 30(0.2,-14.5) 31(0.2,-15) 32(0.2,-15.5) 33(0.2,-16) 34(0.2,-16.5) 35(0.2,-17) 36(0.2,-17.5) 37(0.2,-18) 38(0.2,-18.5) 39(0.2,-19) 40(0.2,-19.5) 41(0.2,-20) 42(0.2,-20.5) 43(0.2,-21) 44(0.2,-21.5) 45(0.2,-22) 46(0.2,-22.5) 47(0.2,-23) 48(0.2,-23.5) 49(0.2,-24) 50(0.2,-24.5) 51(0.2,-25) 52(0.2,-25.5) 105(30.3,-25.5) 106(30.3,-25) 107(30.3,-24.5) 108(30.3,-24) 109(30.3,-23.5) 110(30.3,-23) 111(30.3,-22.5) 112(30.3,-22) 113(30.3,-21.5) 114(30.3,-21) 115(30.3,-20.5) 116(30.3,-20) 117(30.3,-19.5) 118(30.3,-19) 119(30.3,-18.5) 120(30.3,-18) 121(30.3,-17.5) 122(30.3,-17) 123(30.3,-16.5) 124(30.3,-16) 125(30.3,-15.5) 126(30.3,-15) 127(30.3,-14.5) 128(30.3,-14) 129(30.3,-13.5) 130(30.3,-13) 131(30.3,-12.5) 132(30.3,-12) 133(30.3,-11.5) 134(30.3,-11) 135(30.3,-10.5) 136(30.3,-10) 137(30.3,-9.5) 138(30.3,-9) 139(30.3,-8.5) 140(30.3,-8) 141(30.3,-7.5) 142(30.3,-7) 143(30.3,-6.5) 144(30.3,-6) 145(30.3,-5.5) 146(30.3,-5) 147(30.3,-4.5) 148(30.3,-4) 149(30.3,-3.5) 150(30.3,-3) 151(30.3,-2.5) 152(30.3,-2) 153(30.3,-1.5) 154(30.3,-1) 155(30.3,-0.5) 156(30.3,0)
  rrect50% 0.25x2 smd: 53(2.5,-27.8) 54(3,-27.8) 55(3.5,-27.8) 56(4,-27.8) 57(4.5,-27.8) 58(5,-27.8) 59(5.5,-27.8) 60(6,-27.8) 61(6.5,-27.8) 62(7,-27.8) 63(7.5,-27.8) 64(8,-27.8) 65(8.5,-27.8) 66(9,-27.8) 67(9.5,-27.8) 68(10,-27.8) 69(10.5,-27.8) 70(11,-27.8) 71(11.5,-27.8) 72(12,-27.8) 73(12.5,-27.8) 74(13,-27.8) 75(13.5,-27.8) 76(14,-27.8) 77(14.5,-27.8) 78(15,-27.8) 79(15.5,-27.8) 80(16,-27.8) 81(16.5,-27.8) 82(17,-27.8) 83(17.5,-27.8) 84(18,-27.8) 85(18.5,-27.8) 86(19,-27.8) 87(19.5,-27.8) 88(20,-27.8) 89(20.5,-27.8) 90(21,-27.8) 91(21.5,-27.8) 92(22,-27.8) 93(22.5,-27.8) 94(23,-27.8) 95(23.5,-27.8) 96(24,-27.8) 97(24.5,-27.8) 98(25,-27.8) 99(25.5,-27.8) 100(26,-27.8) 101(26.5,-27.8) 102(27,-27.8) 103(27.5,-27.8) 104(28,-27.8) 157(28,2.3) 158(27.5,2.3) 159(27,2.3) 160(26.5,2.3) 161(26,2.3) 162(25.5,2.3) 163(25,2.3) 164(24.5,2.3) 165(24,2.3) 166(23.5,2.3) 167(23,2.3) 168(22.5,2.3) 169(22,2.3) 170(21.5,2.3) 171(21,2.3) 172(20.5,2.3) 173(20,2.3) 174(19.5,2.3) 175(19,2.3) 176(18.5,2.3) 177(18,2.3) 178(17.5,2.3) 179(17,2.3) 180(16.5,2.3) 181(16,2.3) 182(15.5,2.3) 183(15,2.3) 184(14.5,2.3) 185(14,2.3) 186(13.5,2.3) 187(13,2.3) 188(12.5,2.3) 189(12,2.3) 190(11.5,2.3) 191(11,2.3) 192(10.5,2.3) 193(10,2.3) 194(9.5,2.3) 195(9,2.3) 196(8.5,2.3) 197(8,2.3) 198(7.5,2.3) 199(7,2.3) 200(6.5,2.3) 201(6,2.3) 202(5.5,2.3) 203(5,2.3) 204(4.5,2.3) 205(4,2.3) 206(3.5,2.3) 207(3,2.3) 208(2.5,2.3)
Top Overlay:
  circle w0.5: c0.2,0.9 r0.2
  lines w0.25: 1.1,-26 1.1,-26.9 2,-26.9 ; 1.1,0.5 1.1,1.4 2,1.4 ; 28.5,-26.9 29.4,-26.9 29.4,-26 ; 28.5,1.4 29.4,1.4 29.4,0.5
  lines w0.254: 1.6,-26.4 28.9,-26.4 28.9,0.9 1.6,0.9 1.6,-26.4
Top Assembly:
  text ".Designator" at 10.602,-13.133 h1
3D body "qfp22-208-145.STEP": height 1.6, standoff 0, extent 0.235,-27.769 30.263,2.259

## SQFP50P3120X3120X410-208N [mm] "SQFP, 208-Leads, Body 31.3x31.3mm (max), Pitch 0.50mm, IPC Medium Density"
height 4.1
pads (208):
  oval 1.95x0.3 smd: 1(-15.025,12.75) 2(-15.025,12.25) 3(-15.025,11.75) 4(-15.025,11.25) 5(-15.025,10.75) 6(-15.025,10.25) 7(-15.025,9.75) 8(-15.025,9.25) 9(-15.025,8.75) 10(-15.025,8.25) 11(-15.025,7.75) 12(-15.025,7.25) 13(-15.025,6.75) 14(-15.025,6.25) 15(-15.025,5.75) 16(-15.025,5.25) 17(-15.025,4.75) 18(-15.025,4.25) 19(-15.025,3.75) 20(-15.025,3.25) 21(-15.025,2.75) 22(-15.025,2.25) 23(-15.025,1.75) 24(-15.025,1.25) 25(-15.025,0.75) 26(-15.025,0.25) 27(-15.025,-0.25) 28(-15.025,-0.75) 29(-15.025,-1.25) 30(-15.025,-1.75) 31(-15.025,-2.25) 32(-15.025,-2.75) 33(-15.025,-3.25) 34(-15.025,-3.75) 35(-15.025,-4.25) 36(-15.025,-4.75) 37(-15.025,-5.25) 38(-15.025,-5.75) 39(-15.025,-6.25) 40(-15.025,-6.75) 41(-15.025,-7.25) 42(-15.025,-7.75) 43(-15.025,-8.25) 44(-15.025,-8.75) 45(-15.025,-9.25) 46(-15.025,-9.75) 47(-15.025,-10.25) 48(-15.025,-10.75) 49(-15.025,-11.25) 50(-15.025,-11.75) 51(-15.025,-12.25) 52(-15.025,-12.75) 105(15.025,-12.75) 106(15.025,-12.25) 107(15.025,-11.75) 108(15.025,-11.25) 109(15.025,-10.75) 110(15.025,-10.25) 111(15.025,-9.75) 112(15.025,-9.25) 113(15.025,-8.75) 114(15.025,-8.25) 115(15.025,-7.75) 116(15.025,-7.25) 117(15.025,-6.75) 118(15.025,-6.25) 119(15.025,-5.75) 120(15.025,-5.25) 121(15.025,-4.75) 122(15.025,-4.25) 123(15.025,-3.75) 124(15.025,-3.25) 125(15.025,-2.75) 126(15.025,-2.25) 127(15.025,-1.75) 128(15.025,-1.25) 129(15.025,-0.75) 130(15.025,-0.25) 131(15.025,0.25) 132(15.025,0.75) 133(15.025,1.25) 134(15.025,1.75) 135(15.025,2.25) 136(15.025,2.75) 137(15.025,3.25) 138(15.025,3.75) 139(15.025,4.25) 140(15.025,4.75) 141(15.025,5.25) 142(15.025,5.75) 143(15.025,6.25) 144(15.025,6.75) 145(15.025,7.25) 146(15.025,7.75) 147(15.025,8.25) 148(15.025,8.75) 149(15.025,9.25) 150(15.025,9.75) 151(15.025,10.25) 152(15.025,10.75) 153(15.025,11.25) 154(15.025,11.75) 155(15.025,12.25) 156(15.025,12.75)
  oval 0.3x1.95 smd: 53(-12.75,-15.025) 54(-12.25,-15.025) 55(-11.75,-15.025) 56(-11.25,-15.025) 57(-10.75,-15.025) 58(-10.25,-15.025) 59(-9.75,-15.025) 60(-9.25,-15.025) 61(-8.75,-15.025) 62(-8.25,-15.025) 63(-7.75,-15.025) 64(-7.25,-15.025) 65(-6.75,-15.025) 66(-6.25,-15.025) 67(-5.75,-15.025) 68(-5.25,-15.025) 69(-4.75,-15.025) 70(-4.25,-15.025) 71(-3.75,-15.025) 72(-3.25,-15.025) 73(-2.75,-15.025) 74(-2.25,-15.025) 75(-1.75,-15.025) 76(-1.25,-15.025) 77(-0.75,-15.025) 78(-0.25,-15.025) 79(0.25,-15.025) 80(0.75,-15.025) 81(1.25,-15.025) 82(1.75,-15.025) 83(2.25,-15.025) 84(2.75,-15.025) 85(3.25,-15.025) 86(3.75,-15.025) 87(4.25,-15.025) 88(4.75,-15.025) 89(5.25,-15.025) 90(5.75,-15.025) 91(6.25,-15.025) 92(6.75,-15.025) 93(7.25,-15.025) 94(7.75,-15.025) 95(8.25,-15.025) 96(8.75,-15.025) 97(9.25,-15.025) 98(9.75,-15.025) 99(10.25,-15.025) 100(10.75,-15.025) 101(11.25,-15.025) 102(11.75,-15.025) 103(12.25,-15.025) 104(12.75,-15.025) 157(12.75,15.025) 158(12.25,15.025) 159(11.75,15.025) 160(11.25,15.025) 161(10.75,15.025) 162(10.25,15.025) 163(9.75,15.025) 164(9.25,15.025) 165(8.75,15.025) 166(8.25,15.025) 167(7.75,15.025) 168(7.25,15.025) 169(6.75,15.025) 170(6.25,15.025) 171(5.75,15.025) 172(5.25,15.025) 173(4.75,15.025) 174(4.25,15.025) 175(3.75,15.025) 176(3.25,15.025) 177(2.75,15.025) 178(2.25,15.025) 179(1.75,15.025) 180(1.25,15.025) 181(0.75,15.025) 182(0.25,15.025) 183(-0.25,15.025) 184(-0.75,15.025) 185(-1.25,15.025) 186(-1.75,15.025) 187(-2.25,15.025) 188(-2.75,15.025) 189(-3.25,15.025) 190(-3.75,15.025) 191(-4.25,15.025) 192(-4.75,15.025) 193(-5.25,15.025) 194(-5.75,15.025) 195(-6.25,15.025) 196(-6.75,15.025) 197(-7.25,15.025) 198(-7.75,15.025) 199(-8.25,15.025) 200(-8.75,15.025) 201(-9.25,15.025) 202(-9.75,15.025) 203(-10.25,15.025) 204(-10.75,15.025) 205(-11.25,15.025) 206(-11.75,15.025) 207(-12.25,15.025) 208(-12.75,15.025)
Top Overlay:
  circle w0.25: c-15.025,13.45 r0.125
  circle w0.6: c-12.65,12.65 r0.3
  lines w0.2: -13.65,-13.65 -13.65,13.65 13.65,13.65 13.65,-13.65 -13.65,-13.65
Top Assembly:
  text ".Designator" at -4.998,-0.333 h1
3D body: height 4.1, standoff 0.25, extent -14,-14 14,14

## TQFP32(51-85063) [mm]
pads (32):
  rrect50% 1.6x0.4 smd: 1(0,0) 2(0,-0.8) 3(0,-1.6) 4(0,-2.4) 5(0,-3.2) 6(0,-4) 7(0,-4.8) 8(0,-5.6) 17(8.6,-5.6) 18(8.6,-4.8) 19(8.6,-4) 20(8.6,-3.2) 21(8.6,-2.4) 22(8.6,-1.6) 23(8.6,-0.8) 24(8.6,0)
  rrect50% 0.4x1.6 smd: 9(1.5,-7.1) 10(2.3,-7.1) 11(3.1,-7.1) 12(3.9,-7.1) 13(4.7,-7.1) 14(5.5,-7.1) 15(6.3,-7.1) 16(7.1,-7.1) 25(7.1,1.5) 26(6.3,1.5) 27(5.5,1.5) 28(4.7,1.5) 29(3.9,1.5) 30(3.1,1.5) 31(2.3,1.5) 32(1.5,1.5)
Top Overlay:
  circle w0.2: c0,0.7 r0.1
  lines w0.2: 0.7,-6.1 0.7,-6.4 1,-6.4 ; 0.7,0.5 0.7,0.8 1,0.8 ; 7.6,-6.4 7.9,-6.4 7.9,-6.1 ; 7.6,0.8 7.9,0.8 7.9,0.5 ; 1.1,-6 7.5,-6 7.5,0.4 1.1,0.4 1.1,-6
Top Assembly:
  text ".Designator" at -0.698,-3.133 h1